# Altium footprint library ICs And Semiconductors SMD.PcbLib: 943 footprints (part 19 of 60)
Each footprint in its own frame and in the unit in brackets; x right, y up, seen from the top. Pads: shape width x height; smd on the part's side, far side on the other; paste and mask are expansions set on the pad; w line width, h text height; cw(c..) or ccw(c..) is an arc to the next point about the centre after c.
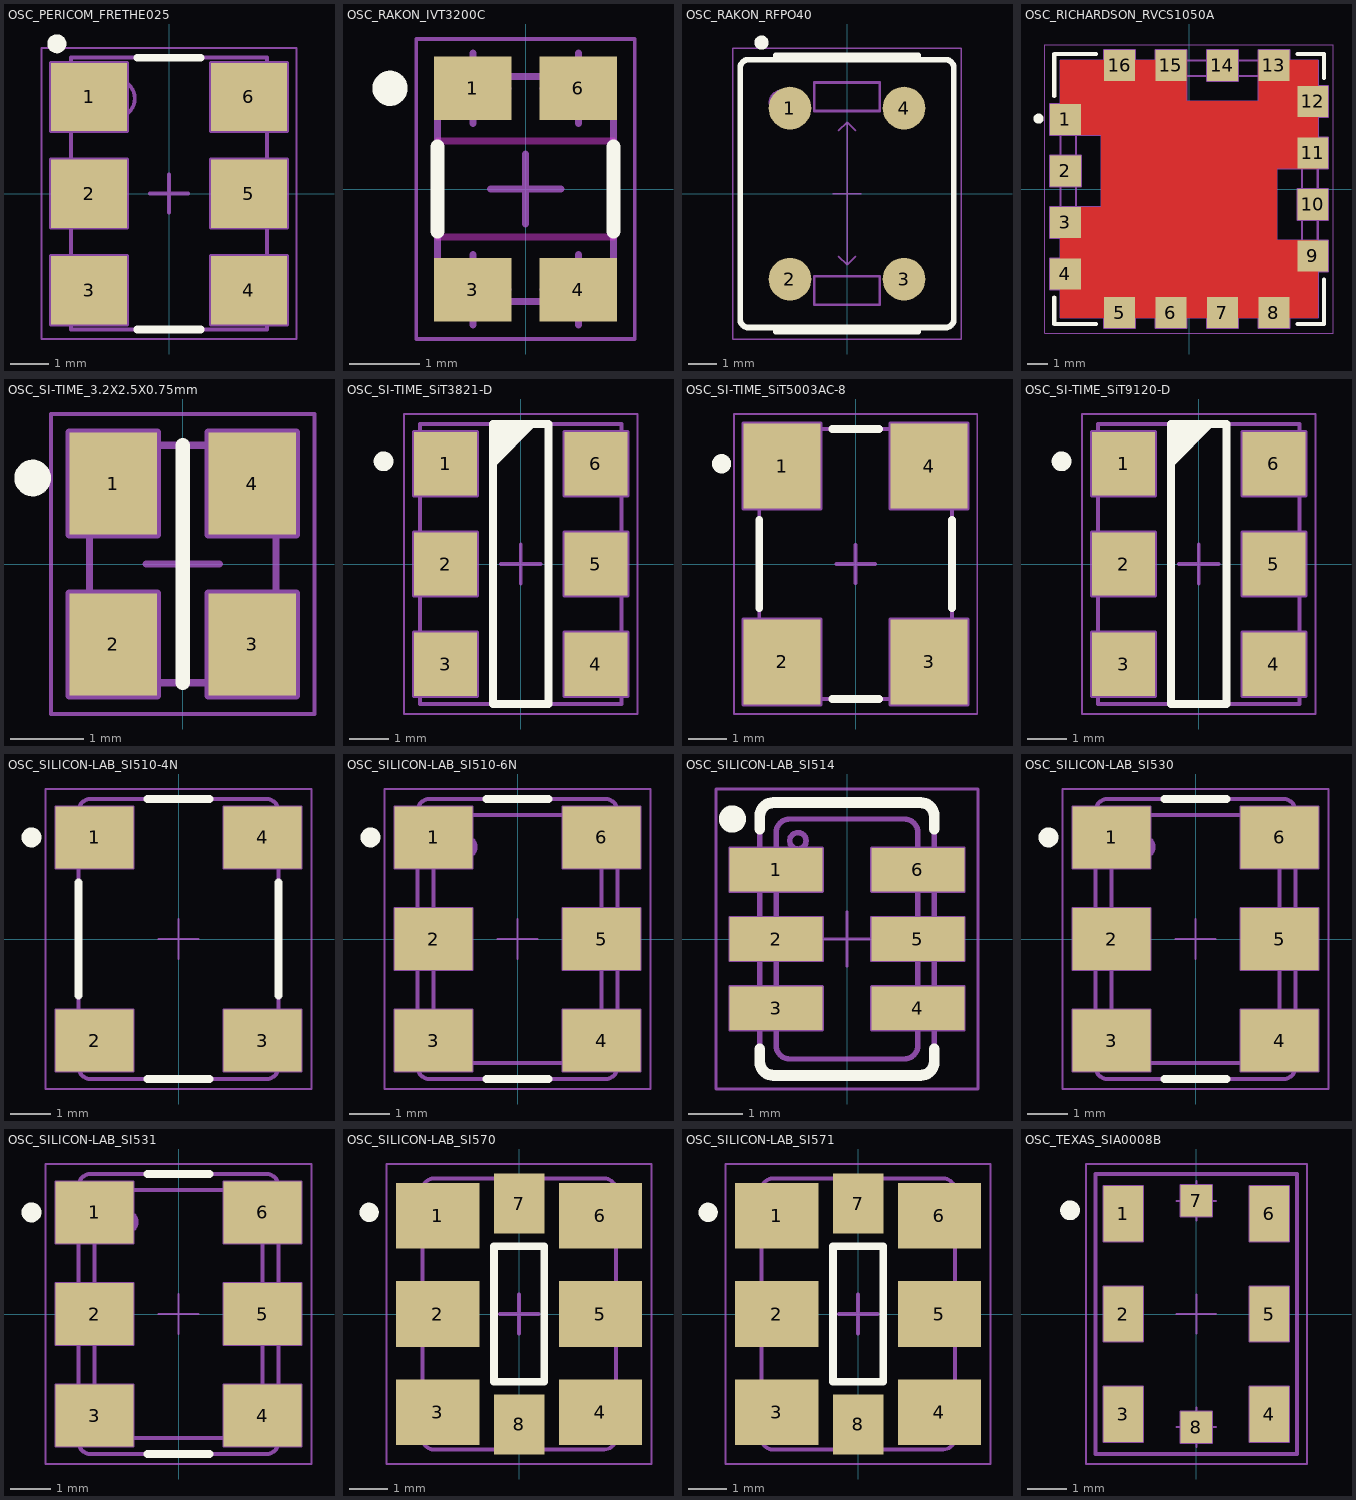
[diagram p18: the footprints below, top view; thin cyan lines are the x and y axes]

## OSC_PERICOM_FRETHE025 [mm] "SMD Oscillator, side convave, 6 pins, 5.00x7.00mm"
height 1.55
pads (6):
  rect 2x1.8 smd: 1(-2.1,2.54) 2(-2.1,0) 3(-2.1,-2.54) 4(2.1,-2.54) 5(2.1,0) 6(2.1,2.54)
Top Overlay:
  circle w0.25: c-2.95,3.94 r0.125
  lines w0.2: -0.832,-3.575 0.832,-3.575 ; -0.832,3.575 0.832,3.575
Mechanical 8:
  lines w0.1: -2.6,-2.54 -2.1,-2.54 ; -2.6,0 -2.1,0 ; -2.6,2.54 -2.1,2.54 ; -2.1,-3.04 -2.1,-2.54 ; -2.1,-2.04 -2.1,-2.54 ; -2.1,-0.5 -2.1,0 ; -2.1,0.5 -2.1,0 ; -2.1,2.04 -2.1,2.54 ; -2.1,3.04 -2.1,2.54 ; -1.6,-2.54 -2.1,-2.54 ; -1.6,0 -2.1,0 ; -1.6,2.54 -2.1,2.54 ; -0.5,0 0,0 ; 0,-0.5 0,0 ; 0,0.5 0,0 ; 0.5,0 0,0 ; 1.6,-2.54 2.1,-2.54 ; 1.6,0 2.1,0 ; 1.6,2.54 2.1,2.54 ; 2.1,-3.04 2.1,-2.54 ; 2.1,-2.04 2.1,-2.54 ; 2.1,-0.5 2.1,0 ; 2.1,0.5 2.1,0 ; 2.1,2.04 2.1,2.54 ; 2.1,3.04 2.1,2.54 ; 2.6,-2.54 2.1,-2.54 ; 2.6,0 2.1,0 ; 2.6,2.54 2.1,2.54 ; -3.1,-3.44 -1.1,-3.44 -1.1,-1.64 -3.1,-1.64 -3.1,-3.44 ; -3.1,-0.9 -1.1,-0.9 -1.1,0.9 -3.1,0.9 -3.1,-0.9 ; -3.1,1.64 -1.1,1.64 -1.1,3.44 -3.1,3.44 -3.1,1.64 ; 1.1,-3.44 3.1,-3.44 3.1,-1.64 1.1,-1.64 1.1,-3.44 ; 1.1,-0.9 3.1,-0.9 3.1,0.9 1.1,0.9 1.1,-0.9 ; 1.1,1.64 3.1,1.64 3.1,3.44 1.1,3.44 1.1,1.64
Mechanical 14:
  circle w0.1: c-1.4,2.5 r0.5
  lines w0.1: -2.575,-3.575 2.575,-3.575 2.575,3.575 -2.575,3.575 -2.575,-3.575
Mechanical 15:
  lines w0.05: -3.35,-3.825 3.35,-3.825 3.35,3.825 -3.35,3.825 -3.35,-3.825
3D body "OSC_PERICOM_FRETHE025.stp": height 1.55, standoff 0, extent -2.575,-3.575 2.575,3.575

## OSC_RAKON_IVT3200C [mm] "Oscillator IVT3200C Serie, Corner Concave; 4 pin, 2.50mm L X 3.2mm W X 1.1mm H"
height 1.1
pads (4):
  rect 1.1x0.9 smd: 1(-0.75,1.43) 3(-0.75,-1.43) 4(0.75,-1.43) 6(0.75,1.43)
Top Layer keep-out:
  lines w0.1: -1.25,-0.68 1.25,-0.68 1.25,0.68 -1.25,0.68 -1.25,-0.68
Top Overlay:
  circle w0.25: c-1.925,1.43 r0.125
  lines w0.2: -1.25,-0.6 -1.25,0.6 ; 1.25,-0.6 1.25,0.6
Mechanical 8:
  lines w0.1: -1.25,-1.43 -0.75,-1.43 ; -1.25,1.43 -0.75,1.43 ; -0.75,-1.93 -0.75,-1.43 ; -0.75,-0.93 -0.75,-1.43 ; -0.75,0.93 -0.75,1.43 ; -0.75,1.93 -0.75,1.43 ; -0.5,0 0,0 ; -0.25,-1.43 -0.75,-1.43 ; -0.25,1.43 -0.75,1.43 ; 0,-0.5 0,0 ; 0,0.5 0,0 ; 0.25,-1.43 0.75,-1.43 ; 0.25,1.43 0.75,1.43 ; 0.5,0 0,0 ; 0.75,-1.93 0.75,-1.43 ; 0.75,-0.93 0.75,-1.43 ; 0.75,0.93 0.75,1.43 ; 0.75,1.93 0.75,1.43 ; 1.25,-1.43 0.75,-1.43 ; 1.25,1.43 0.75,1.43
Mechanical 14:
  lines w0.1: -1.25,-1.5 cw(c-1.25,-1.6) -1.15,-1.6 1.15,-1.6 cw(c1.25,-1.6) 1.25,-1.5 1.25,1.5 cw(c1.25,1.6) 1.15,1.6 -1.15,1.6 cw(c-1.25,1.6) -1.25,1.5 -1.25,-1.5
Mechanical 15:
  lines w0.05: -1.55,-2.13 -1.55,2.13 1.55,2.13 1.55,-2.13 -1.55,-2.13
3D body "OSC_RAKON_IVT3200C.stp": height 1, standoff 0, extent -1.25,-1.6 1.25,1.6

## OSC_RAKON_RFPO40 [mm] "RFPO40 Case, SMD Oscillator, 4 pins, Body 9.7x7.5mm"
height 4.2
pads (4):
  round 1.5 smd: 1(-2,3) 2(-2,-3) 3(2,-3) 4(2,3)
Top Overlay:
  circle w0.25: c-3,5.3 r0.125
  lines w0.2: -2.5,-4.7 -2.5,-4.85 2.5,-4.85 2.5,-4.7 ; -2.5,4.7 -2.5,4.85 2.5,4.85 2.5,4.7 ; -3.75,-4.4 ccw(c-3.45,-4.4) -3.45,-4.7 3.45,-4.7 ccw(c3.45,-4.4) 3.75,-4.4 3.75,4.4 ccw(c3.45,4.4) 3.45,4.7 -3.45,4.7 ccw(c-3.45,4.4) -3.75,4.4 -3.75,-4.4
Mechanical 8:
  lines w0.05: -0.3,-2.2 0,-2.5 ; -0.3,2.2 0,2.5 ; 0.3,-2.2 0,-2.5 ; 0.3,2.2 0,2.5 ; 0,-2.5 0,2.5
  lines w0.1: -2.5,-3 -2,-3 -2,-2.5 ; -2.5,3 -2,3 -2,3.5 ; 1.5,-3 2,-3 2,-2.5 ; 1.5,3 2,3 2,3.5 ; -1.15,-3.9 -1.15,-2.9 1.15,-2.9 1.15,-3.9 -1.15,-3.9 ; -1.15,2.9 -1.15,3.9 1.15,3.9 1.15,2.9 -1.15,2.9
  text "Keepout Area on Top" at -0.5,-2.5 h0.35
Mechanical 14:
  circle w0.1: c-2.3,3.2 r0.4
  lines w0.1: -2.5,-4.7 -2.5,-4.85 2.5,-4.85 2.5,-4.7 ; -2.5,4.7 -2.5,4.85 2.5,4.85 2.5,4.7 ; -3.75,-4.4 ccw(c-3.45,-4.4) -3.45,-4.7 3.45,-4.7 ccw(c3.45,-4.4) 3.75,-4.4 3.75,4.4 ccw(c3.45,4.4) 3.45,4.7 -3.45,4.7 ccw(c-3.45,4.4) -3.75,4.4 -3.75,-4.4
Mechanical 15:
  lines w0.05: -0.5,0 0.5,0 ; 0,-0.5 0,0.5 ; -4,-5.1 -4,5.1 4,5.1 4,-5.1 -4,-5.1
3D body "OSC_RAKON_RFPO40.stp": height 5.95, standoff 0, extent -3.75,-4.85 3.75,4.85

## OSC_RICHARDSON_RVCS1050A [mm] "LCC, 2.54mm Pitch, Square; 16 Pin, 12.7mm L X 12.7mm W X 4.00mm H Body, IPC Medium Density"
height 4
pads (16):
  rect 1.52x1.52 smd: 1(-6.1,3.43) 2(-6.1,0.89) 3(-6.1,-1.65) 4(-6.1,-4.19) 5(-3.43,-6.1) 6(-0.89,-6.1) 7(1.65,-6.1) 8(4.19,-6.1) 9(6.1,-3.3) 10(6.1,-0.76) 11(6.1,1.78) 12(6.1,4.32) 13(4.19,6.1) 14(1.65,6.1) 15(-0.89,6.1) 16(-3.43,6.1)
Top Layer:
  region: -6.35,-0.89 -4.324,-0.89 -4.324,2.67 -6.35,2.67 -6.35,6.35 -0.13,6.35 -0.13,4.324 3.43,4.324 3.43,6.35 6.35,6.35 6.35,1.02 4.324,1.02 4.324,-2.54 6.35,-2.54 6.35,-6.35 -6.35,-6.35
Top Overlay:
  circle w0.25: c-7.425,3.475 r0.125
  lines w0.2: -6.65,-5.35 -6.65,-6.65 -4.59,-6.65 ; -6.65,4.59 -6.65,6.65 -4.59,6.65 ; 5.35,-6.65 6.65,-6.65 6.65,-4.46 ; 5.35,6.65 6.65,6.65 6.65,5.48
Mechanical 8:
  lines w0.1: -6.6,-4.19 -6.1,-4.19 ; -6.6,-1.65 -6.1,-1.65 ; -6.6,0.89 -6.1,0.89 ; -6.6,3.43 -6.1,3.43 ; -6.1,-4.69 -6.1,-4.19 ; -6.1,-3.69 -6.1,-4.19 ; -6.1,-2.15 -6.1,-1.65 ; -6.1,-1.15 -6.1,-1.65 ; -6.1,0.39 -6.1,0.89 ; -6.1,1.39 -6.1,0.89 ; -6.1,2.93 -6.1,3.43 ; -6.1,3.93 -6.1,3.43 ; -5.6,-4.19 -6.1,-4.19 ; -5.6,-1.65 -6.1,-1.65 ; -5.6,0.89 -6.1,0.89 ; -5.6,3.43 -6.1,3.43 ; -3.93,-6.1 -3.43,-6.1 ; -3.93,6.1 -3.43,6.1 ; -3.43,-6.6 -3.43,-6.1 ; -3.43,-5.6 -3.43,-6.1 ; -3.43,5.6 -3.43,6.1 ; -3.43,6.6 -3.43,6.1 ; -2.93,-6.1 -3.43,-6.1 ; -2.93,6.1 -3.43,6.1 ; -1.39,-6.1 -0.89,-6.1 ; -1.39,6.1 -0.89,6.1 ; -0.89,-6.6 -0.89,-6.1 ; -0.89,-5.6 -0.89,-6.1 ; -0.89,5.6 -0.89,6.1 ; -0.89,6.6 -0.89,6.1 ; -0.5,0 0,0 ; -0.39,-6.1 -0.89,-6.1 ; -0.39,6.1 -0.89,6.1 ; 0,-0.5 0,0 ; 0,0.5 0,0 ; 0.5,0 0,0 ; 1.15,-6.1 1.65,-6.1 ; 1.15,6.1 1.65,6.1 ; 1.65,-6.6 1.65,-6.1 ; 1.65,-5.6 1.65,-6.1 ; 1.65,5.6 1.65,6.1 ; 1.65,6.6 1.65,6.1 ; 2.15,-6.1 1.65,-6.1 ; 2.15,6.1 1.65,6.1 ; 3.69,-6.1 4.19,-6.1 ; 3.69,6.1 4.19,6.1 ; 4.19,-6.6 4.19,-6.1 ; 4.19,-5.6 4.19,-6.1 ; 4.19,5.6 4.19,6.1 ; 4.19,6.6 4.19,6.1 ; 4.69,-6.1 4.19,-6.1 ; 4.69,6.1 4.19,6.1 ; 5.6,-3.3 6.1,-3.3 ; 5.6,-0.76 6.1,-0.76 ; 5.6,1.78 6.1,1.78 ; 5.6,4.32 6.1,4.32 ; 6.1,-3.8 6.1,-3.3 ; 6.1,-2.8 6.1,-3.3 ; 6.1,-1.26 6.1,-0.76 ; 6.1,-0.26 6.1,-0.76 ; 6.1,1.28 6.1,1.78 ; 6.1,2.28 6.1,1.78 ; 6.1,3.82 6.1,4.32 ; 6.1,4.82 6.1,4.32 ; 6.6,-3.3 6.1,-3.3 ; 6.6,-0.76 6.1,-0.76 ; 6.6,1.78 6.1,1.78 ; 6.6,4.32 6.1,4.32 ; -6.86,-4.95 -6.86,-3.43 -5.34,-3.43 -5.34,-4.95 -6.86,-4.95 ; -6.86,-2.41 -6.86,-0.89 -5.34,-0.89 -5.34,-2.41 -6.86,-2.41 ; -6.86,0.13 -6.86,1.65 -5.34,1.65 -5.34,0.13 -6.86,0.13 ; -6.86,2.67 -6.86,4.19 -5.34,4.19 -5.34,2.67 -6.86,2.67 ; -6.35,-6.35 6.35,-6.35 6.35,-2.54 4.324,-2.54 4.324,1.02 6.35,1.02 6.35,6.35 3.43,6.35 3.43,4.324 -0.13,4.324 -0.13,6.35 -6.35,6.35 -6.35,2.67 -4.324,2.67 -4.324,-0.89 -6.35,-0.89 -6.35,-6.35 ; -4.19,-6.86 -4.19,-5.34 -2.67,-5.34 -2.67,-6.86 -4.19,-6.86 ; -4.19,5.34 -4.19,6.86 -2.67,6.86 -2.67,5.34 -4.19,5.34 ; -1.65,-6.86 -1.65,-5.34 -0.13,-5.34 -0.13,-6.86 -1.65,-6.86 ; -1.65,5.34 -1.65,6.86 -0.13,6.86 -0.13,5.34 -1.65,5.34 ; 0.89,-6.86 0.89,-5.34 2.41,-5.34 2.41,-6.86 0.89,-6.86 ; 0.89,5.34 0.89,6.86 2.41,6.86 2.41,5.34 0.89,5.34 ; 3.43,-6.86 3.43,-5.34 4.95,-5.34 4.95,-6.86 3.43,-6.86 ; 3.43,5.34 3.43,6.86 4.95,6.86 4.95,5.34 3.43,5.34 ; 5.34,-4.06 5.34,-2.54 6.86,-2.54 6.86,-4.06 5.34,-4.06 ; 5.34,-1.52 5.34,0 6.86,0 6.86,-1.52 5.34,-1.52 ; 5.34,1.02 5.34,2.54 6.86,2.54 6.86,1.02 5.34,1.02 ; 5.34,3.56 5.34,5.08 6.86,5.08 6.86,3.56 5.34,3.56
Mechanical 14:
  circle w0.1: c-4.28,4.28 r0.5
  lines w0.1: -6.35,-6.35 -3.95,-6.35 cw(c-3.43,-6.65) -2.91,-6.35 -1.41,-6.35 cw(c-0.89,-6.65) -0.37,-6.35 1.13,-6.35 cw(c1.65,-6.65) 2.17,-6.35 3.67,-6.35 cw(c4.19,-6.65) 4.71,-6.35 6.35,-6.35 6.35,-3.82 cw(c6.65,-3.3) 6.35,-2.78 6.35,-1.28 cw(c6.65,-0.76) 6.35,-0.24 6.35,1.26 cw(c6.65,1.78) 6.35,2.3 6.35,3.8 cw(c6.65,4.32) 6.35,4.84 6.35,6.35 4.71,6.35 cw(c4.19,6.65) 3.67,6.35 2.17,6.35 cw(c1.65,6.65) 1.13,6.35 -0.37,6.35 cw(c-0.89,6.65) -1.41,6.35 -2.91,6.35 cw(c-3.43,6.65) -3.95,6.35 -6.35,6.35 -6.35,3.95 cw(c-6.65,3.43) -6.35,2.91 -6.35,1.41 cw(c-6.65,0.89) -6.35,0.37 -6.35,-1.13 cw(c-6.65,-1.65) -6.35,-2.17 -6.35,-3.67 cw(c-6.65,-4.19) -6.35,-4.71 -6.35,-6.35 ; -5.58,-5.28 ccw(c-5.28,-5.28) -5.28,-5.58 5.28,-5.58 ccw(c5.28,-5.28) 5.58,-5.28 5.58,5.28 ccw(c5.28,5.28) 5.28,5.58 -5.28,5.58 ccw(c-5.28,5.28) -5.58,5.28 -5.58,-5.28
Mechanical 15:
  lines w0.05: -7.11,-7.11 -7.11,7.11 7.11,7.11 7.11,-7.11 -7.11,-7.11
3D body "OSC_RICHARDSON_RVCS1050A.stp": height 4, standoff 0, extent -6.35,-6.35 6.35,6.35

## OSC_SI-TIME_3.2X2.5X0.75mm [mm] "Si Time Oscillators, 4 Pin, Pitch 2.1mm, 3.2mm x 2.5mm x0.75mm"
height 0.8
pads (4):
  rect 1.2x1.4 smd: 1(-0.95,1.1) 2(-0.95,-1.1) 3(0.95,-1.1) 4(0.95,1.1)
Top Overlay:
  circle w0.25: c-2.05,1.175 r0.125
  lines w0.2: 0,-1.625 0,1.625
Mechanical 8:
  lines w0.1: -1.45,-1.1 -0.95,-1.1 ; -1.45,1.1 -0.95,1.1 ; -0.95,-1.6 -0.95,-1.1 ; -0.95,-0.6 -0.95,-1.1 ; -0.95,0.6 -0.95,1.1 ; -0.95,1.6 -0.95,1.1 ; -0.5,0 0,0 ; -0.45,-1.1 -0.95,-1.1 ; -0.45,1.1 -0.95,1.1 ; 0,-0.5 0,0 ; 0,0.5 0,0 ; 0.45,-1.1 0.95,-1.1 ; 0.45,1.1 0.95,1.1 ; 0.5,0 0,0 ; 0.95,-1.6 0.95,-1.1 ; 0.95,-0.6 0.95,-1.1 ; 0.95,0.6 0.95,1.1 ; 0.95,1.6 0.95,1.1 ; 1.45,-1.1 0.95,-1.1 ; 1.45,1.1 0.95,1.1 ; -1.55,-1.8 -1.55,-0.4 -0.35,-0.4 -0.35,-1.8 -1.55,-1.8 ; -1.55,0.4 -1.55,1.8 -0.35,1.8 -0.35,0.4 -1.55,0.4 ; 0.35,-1.8 0.35,-0.4 1.55,-0.4 1.55,-1.8 0.35,-1.8 ; 0.35,0.4 0.35,1.8 1.55,1.8 1.55,0.4 0.35,0.4
Mechanical 14:
  circle w0.1: c-0.775,1.125 r0.25
  lines w0.1: -1.275,-1.625 1.275,-1.625 1.275,1.625 -1.275,1.625 -1.275,-1.625
Mechanical 15:
  lines w0.05: -1.8,-2.05 -1.8,2.05 1.8,2.05 1.8,-2.05 -1.8,-2.05
3D body "OSC_SI-TIME_3.2X2.5X0.75.stp": height 0.8, standoff 0, extent -1.275,-1.625 1.275,1.625

## OSC_SI-TIME_SiT3821-D [mm] "SiT3821 Oscillators Series, Version 7mmx5mm, Pitch 2.54mm; 6 Pin"
height 1
pads (6):
  rect 1.6x1.6 smd: 1(-1.905,2.54) 2(-1.905,0) 3(-1.905,-2.54) 4(1.905,-2.54) 5(1.905,0) 6(1.905,2.54)
Top Overlay:
  circle w0.25: c-3.475,2.6 r0.125
  lines w0.2: -0.705,2.55 0.295,3.55 ; -0.705,2.75 0.095,3.55 ; -0.705,2.95 -0.105,3.55 ; -0.705,3.15 -0.305,3.55 ; -0.705,3.35 -0.505,3.55 ; -0.705,-3.55 0.705,-3.55 0.705,3.55 -0.705,3.55 -0.705,-3.55
Mechanical 8:
  lines w0.1: -2.405,-2.54 -1.905,-2.54 ; -2.405,0 -1.905,0 ; -2.405,2.54 -1.905,2.54 ; -1.905,-3.04 -1.905,-2.54 ; -1.905,-2.04 -1.905,-2.54 ; -1.905,-0.5 -1.905,0 ; -1.905,0.5 -1.905,0 ; -1.905,2.04 -1.905,2.54 ; -1.905,3.04 -1.905,2.54 ; -1.405,-2.54 -1.905,-2.54 ; -1.405,0 -1.905,0 ; -1.405,2.54 -1.905,2.54 ; -0.5,0 0,0 ; 0,-0.5 0,0 ; 0,0.5 0,0 ; 0.5,0 0,0 ; 1.405,-2.54 1.905,-2.54 ; 1.405,0 1.905,0 ; 1.405,2.54 1.905,2.54 ; 1.905,-3.04 1.905,-2.54 ; 1.905,-2.04 1.905,-2.54 ; 1.905,-0.5 1.905,0 ; 1.905,0.5 1.905,0 ; 1.905,2.04 1.905,2.54 ; 1.905,3.04 1.905,2.54 ; 2.405,-2.54 1.905,-2.54 ; 2.405,0 1.905,0 ; 2.405,2.54 1.905,2.54 ; -2.705,-3.34 -2.705,-1.74 -1.105,-1.74 -1.105,-3.34 -2.705,-3.34 ; -2.705,-0.8 -2.705,0.8 -1.105,0.8 -1.105,-0.8 -2.705,-0.8 ; -2.705,1.74 -2.705,3.34 -1.105,3.34 -1.105,1.74 -2.705,1.74 ; 1.105,-3.34 1.105,-1.74 2.705,-1.74 2.705,-3.34 1.105,-3.34 ; 1.105,-0.8 1.105,0.8 2.705,0.8 2.705,-0.8 1.105,-0.8 ; 1.105,1.74 1.105,3.34 2.705,3.34 2.705,1.74 1.105,1.74
Mechanical 14:
  circle w0.1: c-1.505,2.55 r0.4
  lines w0.1: -2.55,-3.55 2.55,-3.55 2.55,3.55 -2.55,3.55 -2.55,-3.55
Mechanical 15:
  lines w0.05: -2.955,-3.8 -2.955,3.8 2.955,3.8 2.955,-3.8 -2.955,-3.8
3D body "OSC_SI TIME_SiT3821-D.stp": height 1, standoff 0, extent -2.55,-3.55 2.55,3.55

## OSC_SI-TIME_SiT5003AC-8 [mm] "SiT5003AC Oscillator, Version 5.08mm Pitch; 4 Pin, 5.00mm L X 7.00mm W X 1mm H"
height 1
pads (4):
  rect 2x2.2 smd: 1(-1.905,2.54) 2(-1.905,-2.54) 3(1.905,-2.54) 4(1.905,2.54)
Top Overlay:
  circle w0.25: c-3.475,2.6 r0.125
  lines w0.2: -2.5,-1.14 -2.5,1.14 ; -0.605,-3.5 0.605,-3.5 ; -0.605,3.5 0.605,3.5 ; 2.5,-1.14 2.5,1.14
Mechanical 8:
  lines w0.1: -2.405,-2.54 -1.905,-2.54 ; -2.405,2.54 -1.905,2.54 ; -1.905,-3.04 -1.905,-2.54 ; -1.905,-2.04 -1.905,-2.54 ; -1.905,2.04 -1.905,2.54 ; -1.905,3.04 -1.905,2.54 ; -1.405,-2.54 -1.905,-2.54 ; -1.405,2.54 -1.905,2.54 ; -0.5,0 0,0 ; 0,-0.5 0,0 ; 0,0.5 0,0 ; 0.5,0 0,0 ; 1.405,-2.54 1.905,-2.54 ; 1.405,2.54 1.905,2.54 ; 1.905,-3.04 1.905,-2.54 ; 1.905,-2.04 1.905,-2.54 ; 1.905,2.04 1.905,2.54 ; 1.905,3.04 1.905,2.54 ; 2.405,-2.54 1.905,-2.54 ; 2.405,2.54 1.905,2.54 ; -2.905,-3.64 -0.905,-3.64 -0.905,-1.44 -2.905,-1.44 -2.905,-3.64 ; -2.905,1.44 -0.905,1.44 -0.905,3.64 -2.905,3.64 -2.905,1.44 ; 0.905,-3.64 2.905,-3.64 2.905,-1.44 0.905,-1.44 0.905,-3.64 ; 0.905,1.44 2.905,1.44 2.905,3.64 0.905,3.64 0.905,1.44
Mechanical 14:
  circle w0.1: c-1.505,2.55 r0.4
  lines w0.1: -2.5,-3.5 -2.5,3.5 2.5,3.5 2.5,-3.5 -2.5,-3.5
Mechanical 15:
  lines w0.05: -3.155,-3.89 -3.155,3.89 3.155,3.89 3.155,-3.89 -3.155,-3.89
3D body "OSC_SI-TIME_SiT5003AC-8.stp": height 1, standoff 0, extent -2.5,-3.5 2.5,3.5

## OSC_SI-TIME_SiT9120-D [mm] "SiT9120 Oscillators Series, Version 7mmx5mm, Pitch 2.54mm; 6 Pin"
height 1
pads (6):
  rect 1.6x1.6 smd: 1(-1.905,2.54) 2(-1.905,0) 3(-1.905,-2.54) 4(1.905,-2.54) 5(1.905,0) 6(1.905,2.54)
Top Overlay:
  circle w0.25: c-3.475,2.6 r0.125
  lines w0.2: -0.705,2.55 0.295,3.55 ; -0.705,2.75 0.095,3.55 ; -0.705,2.95 -0.105,3.55 ; -0.705,3.15 -0.305,3.55 ; -0.705,3.35 -0.505,3.55 ; -0.705,-3.55 0.705,-3.55 0.705,3.55 -0.705,3.55 -0.705,-3.55
Mechanical 8:
  lines w0.1: -2.405,-2.54 -1.905,-2.54 ; -2.405,0 -1.905,0 ; -2.405,2.54 -1.905,2.54 ; -1.905,-3.04 -1.905,-2.54 ; -1.905,-2.04 -1.905,-2.54 ; -1.905,-0.5 -1.905,0 ; -1.905,0.5 -1.905,0 ; -1.905,2.04 -1.905,2.54 ; -1.905,3.04 -1.905,2.54 ; -1.405,-2.54 -1.905,-2.54 ; -1.405,0 -1.905,0 ; -1.405,2.54 -1.905,2.54 ; -0.5,0 0,0 ; 0,-0.5 0,0 ; 0,0.5 0,0 ; 0.5,0 0,0 ; 1.405,-2.54 1.905,-2.54 ; 1.405,0 1.905,0 ; 1.405,2.54 1.905,2.54 ; 1.905,-3.04 1.905,-2.54 ; 1.905,-2.04 1.905,-2.54 ; 1.905,-0.5 1.905,0 ; 1.905,0.5 1.905,0 ; 1.905,2.04 1.905,2.54 ; 1.905,3.04 1.905,2.54 ; 2.405,-2.54 1.905,-2.54 ; 2.405,0 1.905,0 ; 2.405,2.54 1.905,2.54 ; -2.705,-3.34 -2.705,-1.74 -1.105,-1.74 -1.105,-3.34 -2.705,-3.34 ; -2.705,-0.8 -2.705,0.8 -1.105,0.8 -1.105,-0.8 -2.705,-0.8 ; -2.705,1.74 -2.705,3.34 -1.105,3.34 -1.105,1.74 -2.705,1.74 ; 1.105,-3.34 1.105,-1.74 2.705,-1.74 2.705,-3.34 1.105,-3.34 ; 1.105,-0.8 1.105,0.8 2.705,0.8 2.705,-0.8 1.105,-0.8 ; 1.105,1.74 1.105,3.34 2.705,3.34 2.705,1.74 1.105,1.74
Mechanical 14:
  circle w0.1: c-1.505,2.55 r0.4
  lines w0.1: -2.55,-3.55 2.55,-3.55 2.55,3.55 -2.55,3.55 -2.55,-3.55
Mechanical 15:
  lines w0.05: -2.955,-3.8 -2.955,3.8 2.955,3.8 2.955,-3.8 -2.955,-3.8
3D body "OSC_SI-TIME_SiT9120-D.stp": height 1, standoff 0, extent -2.55,-3.55 2.55,3.55

## OSC_SILICON-LAB_SI510-4N [mm] "Oscillator Si510 Series, 4 pins, 5x7mm"
height 1.8
pads (4):
  rect 1.95x1.55 smd: 1(-2.1,2.54) 2(-2.1,-2.54) 3(2.1,-2.54) 4(2.1,2.54)
Top Overlay:
  circle w0.25: c-3.675,2.54 r0.125
  lines w0.2: -2.5,-1.415 -2.5,1.415 ; -0.775,-3.5 0.775,-3.5 ; -0.775,3.5 0.775,3.5 ; 2.5,-1.415 2.5,1.415
Mechanical 8:
  lines w0.05: -2.6,-2.54 -2.1,-2.54 ; -2.6,2.54 -2.1,2.54 ; -2.1,-3.04 -2.1,-2.54 ; -2.1,-2.04 -2.1,-2.54 ; -2.1,2.04 -2.1,2.54 ; -2.1,3.04 -2.1,2.54 ; -1.6,-2.54 -2.1,-2.54 ; -1.6,2.54 -2.1,2.54 ; -0.5,0 0,0 ; 0,-0.5 0,0 ; 0,0.5 0,0 ; 0.5,0 0,0 ; 1.6,-2.54 2.1,-2.54 ; 1.6,2.54 2.1,2.54 ; 2.1,-3.04 2.1,-2.54 ; 2.1,-2.04 2.1,-2.54 ; 2.1,2.04 2.1,2.54 ; 2.1,3.04 2.1,2.54 ; 2.6,-2.54 2.1,-2.54 ; 2.6,2.54 2.1,2.54 ; -3.075,-3.315 -3.075,-1.765 -1.125,-1.765 -1.125,-3.315 -3.075,-3.315 ; -3.075,1.765 -3.075,3.315 -1.125,3.315 -1.125,1.765 -3.075,1.765 ; 1.125,-3.315 1.125,-1.765 3.075,-1.765 3.075,-3.315 1.125,-3.315 ; 1.125,1.765 1.125,3.315 3.075,3.315 3.075,1.765 1.125,1.765
Mechanical 14:
  circle w0.1: c-1.7,2.55 r0.4
  lines w0.1: -2.5,-3.2 ccw(c-2.2,-3.2) -2.2,-3.5 2.2,-3.5 ccw(c2.2,-3.2) 2.5,-3.2 2.5,3.2 ccw(c2.2,3.2) 2.2,3.5 -2.2,3.5 ccw(c-2.2,3.2) -2.5,3.2 -2.5,-3.2
Mechanical 15:
  lines w0.05: -3.325,-3.75 3.325,-3.75 3.325,3.75 -3.325,3.75 -3.325,-3.75
3D body "OSC_SILICON-LAB_SI510-4N.stp": height 1.8, standoff 0, extent -2.5,-3.5 2.5,3.5

## OSC_SILICON-LAB_SI510-6N [mm] "Oscillator Si510 Series, 6 pins, 5x7mm"
height 1.8
pads (6):
  rect 1.95x1.55 smd: 1(-2.1,2.54) 2(-2.1,0) 3(-2.1,-2.54) 4(2.1,-2.54) 5(2.1,0) 6(2.1,2.54)
Top Overlay:
  circle w0.25: c-3.675,2.54 r0.125
  lines w0.2: -0.775,-3.5 0.775,-3.5 ; -0.775,3.5 0.775,3.5
Mechanical 8:
  lines w0.05: -2.6,-2.54 -2.1,-2.54 ; -2.6,0 -2.1,0 ; -2.6,2.54 -2.1,2.54 ; -2.1,-3.04 -2.1,-2.54 ; -2.1,-2.04 -2.1,-2.54 ; -2.1,-0.5 -2.1,0 ; -2.1,0.5 -2.1,0 ; -2.1,2.04 -2.1,2.54 ; -2.1,3.04 -2.1,2.54 ; -1.6,-2.54 -2.1,-2.54 ; -1.6,0 -2.1,0 ; -1.6,2.54 -2.1,2.54 ; -0.5,0 0,0 ; 0,-0.5 0,0 ; 0,0.5 0,0 ; 0.5,0 0,0 ; 1.6,-2.54 2.1,-2.54 ; 1.6,0 2.1,0 ; 1.6,2.54 2.1,2.54 ; 2.1,-3.04 2.1,-2.54 ; 2.1,-2.04 2.1,-2.54 ; 2.1,-0.5 2.1,0 ; 2.1,0.5 2.1,0 ; 2.1,2.04 2.1,2.54 ; 2.1,3.04 2.1,2.54 ; 2.6,-2.54 2.1,-2.54 ; 2.6,0 2.1,0 ; 2.6,2.54 2.1,2.54 ; -3.075,-3.315 -3.075,-1.765 -1.125,-1.765 -1.125,-3.315 -3.075,-3.315 ; -3.075,-0.775 -3.075,0.775 -1.125,0.775 -1.125,-0.775 -3.075,-0.775 ; -3.075,1.765 -3.075,3.315 -1.125,3.315 -1.125,1.765 -3.075,1.765 ; 1.125,-3.315 1.125,-1.765 3.075,-1.765 3.075,-3.315 1.125,-3.315 ; 1.125,-0.775 1.125,0.775 3.075,0.775 3.075,-0.775 1.125,-0.775 ; 1.125,1.765 1.125,3.315 3.075,3.315 3.075,1.765 1.125,1.765
Mechanical 14:
  circle w0.1: c-1.3,2.3 r0.25
  lines w0.1: -2.5,-3.2 ccw(c-2.2,-3.2) -2.2,-3.5 2.2,-3.5 ccw(c2.2,-3.2) 2.5,-3.2 2.5,3.2 ccw(c2.2,3.2) 2.2,3.5 -2.2,3.5 ccw(c-2.2,3.2) -2.5,3.2 -2.5,-3.2 ; -2.1,-2.8 ccw(c-1.8,-2.8) -1.8,-3.1 1.8,-3.1 ccw(c1.8,-2.8) 2.1,-2.8 2.1,2.8 ccw(c1.8,2.8) 1.8,3.1 -1.8,3.1 ccw(c-1.8,2.8) -2.1,2.8 -2.1,-2.8
Mechanical 15:
  lines w0.05: -3.325,-3.75 3.325,-3.75 3.325,3.75 -3.325,3.75 -3.325,-3.75
3D body "OSC_SILICON-LAB_SI510-6N.stp": height 1.8, standoff 0, extent -2.5,-3.5 2.5,3.5

## OSC_SILICON-LAB_SI514 [mm] "Oscillator Si514 Series, 6 pins, 3.2x5mm"
height 1.28
pads (6):
  rect 1.7x0.8 smd: 1(-1.3,1.27) 2(-1.3,0) 3(-1.3,-1.27) 4(1.3,-1.27) 5(1.3,0) 6(1.3,1.27)
Top Overlay:
  circle w0.25: c-2.1,2.2 r0.125
  lines w0.2: -1.6,-2.02 -1.6,-2.25 ccw(c-1.35,-2.25) -1.35,-2.5 1.35,-2.5 ccw(c1.35,-2.25) 1.6,-2.25 1.6,-2.02 ; -1.6,2.02 -1.6,2.25 cw(c-1.35,2.25) -1.35,2.5 1.35,2.5 cw(c1.35,2.25) 1.6,2.25 1.6,2.02
Mechanical 8:
  lines w0.05: -1.8,-1.27 -1.3,-1.27 ; -1.8,0 -1.3,0 ; -1.8,1.27 -1.3,1.27 ; -1.3,-1.77 -1.3,-1.27 ; -1.3,-0.77 -1.3,-1.27 ; -1.3,-0.5 -1.3,0 ; -1.3,0.5 -1.3,0 ; -1.3,0.77 -1.3,1.27 ; -1.3,1.77 -1.3,1.27 ; -0.8,-1.27 -1.3,-1.27 ; -0.8,0 -1.3,0 ; -0.8,1.27 -1.3,1.27 ; -0.5,0 0,0 ; 0,-0.5 0,0 ; 0,0.5 0,0 ; 0.5,0 0,0 ; 0.8,-1.27 1.3,-1.27 ; 0.8,0 1.3,0 ; 0.8,1.27 1.3,1.27 ; 1.3,-1.77 1.3,-1.27 ; 1.3,-0.77 1.3,-1.27 ; 1.3,-0.5 1.3,0 ; 1.3,0.5 1.3,0 ; 1.3,0.77 1.3,1.27 ; 1.3,1.77 1.3,1.27 ; 1.8,-1.27 1.3,-1.27 ; 1.8,0 1.3,0 ; 1.8,1.27 1.3,1.27 ; -2.15,-1.67 -2.15,-0.87 -0.45,-0.87 -0.45,-1.67 -2.15,-1.67 ; -2.15,-0.4 -2.15,0.4 -0.45,0.4 -0.45,-0.4 -2.15,-0.4 ; -2.15,0.87 -2.15,1.67 -0.45,1.67 -0.45,0.87 -2.15,0.87 ; 0.45,-1.67 0.45,-0.87 2.15,-0.87 2.15,-1.67 0.45,-1.67 ; 0.45,-0.4 0.45,0.4 2.15,0.4 2.15,-0.4 0.45,-0.4 ; 0.45,0.87 0.45,1.67 2.15,1.67 2.15,0.87 0.45,0.87
Mechanical 14:
  circle w0.1: c-0.9,1.8 r0.15
  lines w0.1: -1.6,-2.25 ccw(c-1.35,-2.25) -1.35,-2.5 1.35,-2.5 ccw(c1.35,-2.25) 1.6,-2.25 1.6,2.25 ccw(c1.35,2.25) 1.35,2.5 -1.35,2.5 ccw(c-1.35,2.25) -1.6,2.25 -1.6,-2.25 ; -1.3,-1.95 ccw(c-1.05,-1.95) -1.05,-2.2 1.05,-2.2 ccw(c1.05,-1.95) 1.3,-1.95 1.3,1.95 ccw(c1.05,1.95) 1.05,2.2 -1.05,2.2 ccw(c-1.05,1.95) -1.3,1.95 -1.3,-1.95
Mechanical 15:
  lines w0.05: -2.4,-2.75 2.4,-2.75 2.4,2.75 -2.4,2.75 -2.4,-2.75
3D body "OSC_SILICON-LAB_SI514.stp": height 1.28, standoff 0, extent -1.6,-2.5 1.6,2.5

## OSC_SILICON-LAB_SI530 [mm] "Oscillator Si530 Series, 6 pins, 5x7mm"
height 1.8
pads (6):
  rect 1.95x1.55 smd: 1(-2.1,2.54) 2(-2.1,0) 3(-2.1,-2.54) 4(2.1,-2.54) 5(2.1,0) 6(2.1,2.54)
Top Overlay:
  circle w0.25: c-3.675,2.54 r0.125
  lines w0.2: -0.775,-3.5 0.775,-3.5 ; -0.775,3.5 0.775,3.5
Mechanical 8:
  lines w0.05: -2.6,-2.54 -2.1,-2.54 ; -2.6,0 -2.1,0 ; -2.6,2.54 -2.1,2.54 ; -2.1,-3.04 -2.1,-2.54 ; -2.1,-2.04 -2.1,-2.54 ; -2.1,-0.5 -2.1,0 ; -2.1,0.5 -2.1,0 ; -2.1,2.04 -2.1,2.54 ; -2.1,3.04 -2.1,2.54 ; -1.6,-2.54 -2.1,-2.54 ; -1.6,0 -2.1,0 ; -1.6,2.54 -2.1,2.54 ; -0.5,0 0,0 ; 0,-0.5 0,0 ; 0,0.5 0,0 ; 0.5,0 0,0 ; 1.6,-2.54 2.1,-2.54 ; 1.6,0 2.1,0 ; 1.6,2.54 2.1,2.54 ; 2.1,-3.04 2.1,-2.54 ; 2.1,-2.04 2.1,-2.54 ; 2.1,-0.5 2.1,0 ; 2.1,0.5 2.1,0 ; 2.1,2.04 2.1,2.54 ; 2.1,3.04 2.1,2.54 ; 2.6,-2.54 2.1,-2.54 ; 2.6,0 2.1,0 ; 2.6,2.54 2.1,2.54 ; -3.075,-3.315 -3.075,-1.765 -1.125,-1.765 -1.125,-3.315 -3.075,-3.315 ; -3.075,-0.775 -3.075,0.775 -1.125,0.775 -1.125,-0.775 -3.075,-0.775 ; -3.075,1.765 -3.075,3.315 -1.125,3.315 -1.125,1.765 -3.075,1.765 ; 1.125,-3.315 1.125,-1.765 3.075,-1.765 3.075,-3.315 1.125,-3.315 ; 1.125,-0.775 1.125,0.775 3.075,0.775 3.075,-0.775 1.125,-0.775 ; 1.125,1.765 1.125,3.315 3.075,3.315 3.075,1.765 1.125,1.765
Mechanical 14:
  circle w0.1: c-1.3,2.3 r0.25
  lines w0.1: -2.5,-3.2 ccw(c-2.2,-3.2) -2.2,-3.5 2.2,-3.5 ccw(c2.2,-3.2) 2.5,-3.2 2.5,3.2 ccw(c2.2,3.2) 2.2,3.5 -2.2,3.5 ccw(c-2.2,3.2) -2.5,3.2 -2.5,-3.2 ; -2.1,-2.8 ccw(c-1.8,-2.8) -1.8,-3.1 1.8,-3.1 ccw(c1.8,-2.8) 2.1,-2.8 2.1,2.8 ccw(c1.8,2.8) 1.8,3.1 -1.8,3.1 ccw(c-1.8,2.8) -2.1,2.8 -2.1,-2.8
Mechanical 15:
  lines w0.05: -3.325,-3.75 3.325,-3.75 3.325,3.75 -3.325,3.75 -3.325,-3.75
3D body "OSC_SILICON-LAB_SI510-6N.stp": height 1.8, standoff 0, extent -2.5,-3.5 2.5,3.5

## OSC_SILICON-LAB_SI531 [mm] "Oscillator Si531 Series, 6 pins, 5x7mm"
height 1.8
pads (6):
  rect 1.95x1.55 smd: 1(-2.1,2.54) 2(-2.1,0) 3(-2.1,-2.54) 4(2.1,-2.54) 5(2.1,0) 6(2.1,2.54)
Top Overlay:
  circle w0.25: c-3.675,2.54 r0.125
  lines w0.2: -0.775,-3.5 0.775,-3.5 ; -0.775,3.5 0.775,3.5
Mechanical 8:
  lines w0.05: -2.6,-2.54 -2.1,-2.54 ; -2.6,0 -2.1,0 ; -2.6,2.54 -2.1,2.54 ; -2.1,-3.04 -2.1,-2.54 ; -2.1,-2.04 -2.1,-2.54 ; -2.1,-0.5 -2.1,0 ; -2.1,0.5 -2.1,0 ; -2.1,2.04 -2.1,2.54 ; -2.1,3.04 -2.1,2.54 ; -1.6,-2.54 -2.1,-2.54 ; -1.6,0 -2.1,0 ; -1.6,2.54 -2.1,2.54 ; -0.5,0 0,0 ; 0,-0.5 0,0 ; 0,0.5 0,0 ; 0.5,0 0,0 ; 1.6,-2.54 2.1,-2.54 ; 1.6,0 2.1,0 ; 1.6,2.54 2.1,2.54 ; 2.1,-3.04 2.1,-2.54 ; 2.1,-2.04 2.1,-2.54 ; 2.1,-0.5 2.1,0 ; 2.1,0.5 2.1,0 ; 2.1,2.04 2.1,2.54 ; 2.1,3.04 2.1,2.54 ; 2.6,-2.54 2.1,-2.54 ; 2.6,0 2.1,0 ; 2.6,2.54 2.1,2.54 ; -3.075,-3.315 -3.075,-1.765 -1.125,-1.765 -1.125,-3.315 -3.075,-3.315 ; -3.075,-0.775 -3.075,0.775 -1.125,0.775 -1.125,-0.775 -3.075,-0.775 ; -3.075,1.765 -3.075,3.315 -1.125,3.315 -1.125,1.765 -3.075,1.765 ; 1.125,-3.315 1.125,-1.765 3.075,-1.765 3.075,-3.315 1.125,-3.315 ; 1.125,-0.775 1.125,0.775 3.075,0.775 3.075,-0.775 1.125,-0.775 ; 1.125,1.765 1.125,3.315 3.075,3.315 3.075,1.765 1.125,1.765
Mechanical 14:
  circle w0.1: c-1.3,2.3 r0.25
  lines w0.1: -2.5,-3.2 ccw(c-2.2,-3.2) -2.2,-3.5 2.2,-3.5 ccw(c2.2,-3.2) 2.5,-3.2 2.5,3.2 ccw(c2.2,3.2) 2.2,3.5 -2.2,3.5 ccw(c-2.2,3.2) -2.5,3.2 -2.5,-3.2 ; -2.1,-2.8 ccw(c-1.8,-2.8) -1.8,-3.1 1.8,-3.1 ccw(c1.8,-2.8) 2.1,-2.8 2.1,2.8 ccw(c1.8,2.8) 1.8,3.1 -1.8,3.1 ccw(c-1.8,2.8) -2.1,2.8 -2.1,-2.8
Mechanical 15:
  lines w0.05: -3.325,-3.75 3.325,-3.75 3.325,3.75 -3.325,3.75 -3.325,-3.75
3D body "OSC_SILICON-LAB_SI510-6N.stp": height 1.8, standoff 0, extent -2.5,-3.5 2.5,3.5

## OSC_SILICON-LAB_SI570 [mm] "Oscillator Si570 Series, 8 pins, 5x7mm"
height 1.85
pads (8):
  rect 2.15x1.7 smd: 1(-2.1,2.54) 2(-2.1,0) 3(-2.1,-2.54) 4(2.1,-2.54) 5(2.1,0) 6(2.1,2.54)
  rect 1.3x1.545 smd: 7(0,2.853) 8(0,-2.853)
Top Overlay:
  circle w0.25: c-3.875,2.625 r0.125
  lines w0.2: -0.65,-1.75 -0.65,1.75 0.65,1.75 0.65,-1.75 -0.65,-1.75
Mechanical 8:
  lines w0.1: -2.6,-2.54 -2.1,-2.54 ; -2.6,0 -2.1,0 ; -2.6,2.54 -2.1,2.54 ; -2.1,-3.04 -2.1,-2.54 ; -2.1,-2.04 -2.1,-2.54 ; -2.1,-0.5 -2.1,0 ; -2.1,0.5 -2.1,0 ; -2.1,2.04 -2.1,2.54 ; -2.1,3.04 -2.1,2.54 ; -1.6,-2.54 -2.1,-2.54 ; -1.6,0 -2.1,0 ; -1.6,2.54 -2.1,2.54 ; -0.5,-2.853 0,-2.853 ; -0.5,0 0,0 ; -0.5,2.853 0,2.853 ; 0,-3.353 0,-2.853 ; 0,-2.353 0,-2.853 ; 0,-0.5 0,0 ; 0,0.5 0,0 ; 0,2.353 0,2.853 ; 0,3.353 0,2.853 ; 0.5,-2.853 0,-2.853 ; 0.5,0 0,0 ; 0.5,2.853 0,2.853 ; 1.6,-2.54 2.1,-2.54 ; 1.6,0 2.1,0 ; 1.6,2.54 2.1,2.54 ; 2.1,-3.04 2.1,-2.54 ; 2.1,-2.04 2.1,-2.54 ; 2.1,-0.5 2.1,0 ; 2.1,0.5 2.1,0 ; 2.1,2.04 2.1,2.54 ; 2.1,3.04 2.1,2.54 ; 2.6,-2.54 2.1,-2.54 ; 2.6,0 2.1,0 ; 2.6,2.54 2.1,2.54
Mechanical 14:
  circle w0.1: c-1.7,2.55 r0.4
  lines w0.1: -2.5,-3.2 ccw(c-2.2,-3.2) -2.2,-3.5 2.2,-3.5 ccw(c2.2,-3.2) 2.5,-3.2 2.5,3.2 ccw(c2.2,3.2) 2.2,3.5 -2.2,3.5 ccw(c-2.2,3.2) -2.5,3.2 -2.5,-3.2
Mechanical 15:
  lines w0.05: -3.425,-3.875 -3.425,3.875 3.425,3.875 3.425,-3.875 -3.425,-3.875
3D body "OSC_SILICON-LAB_SI570.stp": height 1.85, standoff 0, extent -2.5,-3.5 2.5,3.5

## OSC_SILICON-LAB_SI571 [mm] "Oscillator Si571 Series, 8 pins, 5x7mm"
height 1.85
pads (8):
  rect 2.15x1.7 smd: 1(-2.1,2.54) 2(-2.1,0) 3(-2.1,-2.54) 4(2.1,-2.54) 5(2.1,0) 6(2.1,2.54)
  rect 1.3x1.545 smd: 7(0,2.853) 8(0,-2.853)
Top Overlay:
  circle w0.25: c-3.875,2.625 r0.125
  lines w0.2: -0.65,-1.75 0.65,-1.75 0.65,1.75 -0.65,1.75 -0.65,-1.75
Mechanical 8:
  lines w0.1: -2.6,-2.54 -2.1,-2.54 ; -2.6,0 -2.1,0 ; -2.6,2.54 -2.1,2.54 ; -2.1,-3.04 -2.1,-2.54 ; -2.1,-2.04 -2.1,-2.54 ; -2.1,-0.5 -2.1,0 ; -2.1,0.5 -2.1,0 ; -2.1,2.04 -2.1,2.54 ; -2.1,3.04 -2.1,2.54 ; -1.6,-2.54 -2.1,-2.54 ; -1.6,0 -2.1,0 ; -1.6,2.54 -2.1,2.54 ; -0.5,-2.853 0,-2.853 ; -0.5,0 0,0 ; -0.5,2.853 0,2.853 ; 0,-3.353 0,-2.853 ; 0,-2.353 0,-2.853 ; 0,-0.5 0,0 ; 0,0.5 0,0 ; 0,2.353 0,2.853 ; 0,3.353 0,2.853 ; 0.5,-2.853 0,-2.853 ; 0.5,0 0,0 ; 0.5,2.853 0,2.853 ; 1.6,-2.54 2.1,-2.54 ; 1.6,0 2.1,0 ; 1.6,2.54 2.1,2.54 ; 2.1,-3.04 2.1,-2.54 ; 2.1,-2.04 2.1,-2.54 ; 2.1,-0.5 2.1,0 ; 2.1,0.5 2.1,0 ; 2.1,2.04 2.1,2.54 ; 2.1,3.04 2.1,2.54 ; 2.6,-2.54 2.1,-2.54 ; 2.6,0 2.1,0 ; 2.6,2.54 2.1,2.54
Mechanical 14:
  circle w0.1: c-1.7,2.55 r0.4
  lines w0.1: -2.5,-3.2 ccw(c-2.2,-3.2) -2.2,-3.5 2.2,-3.5 ccw(c2.2,-3.2) 2.5,-3.2 2.5,3.2 ccw(c2.2,3.2) 2.2,3.5 -2.2,3.5 ccw(c-2.2,3.2) -2.5,3.2 -2.5,-3.2
Mechanical 15:
  lines w0.05: -3.425,-3.875 3.425,-3.875 3.425,3.875 -3.425,3.875 -3.425,-3.875
3D body "OSC_SILICON-LAB_SI571.stp": height 1.85, standoff 0, extent -2.5,-3.5 2.5,3.5

## OSC_TEXAS_SIA0008B [mm] "Oscillator Package SIA, 8 pins, 5x7mm"
height 1.15
pads (8):
  rect 1x1.4 smd: 1(-1.85,2.54) 2(-1.85,0) 3(-1.85,-2.54) 4(1.85,-2.54) 5(1.85,0) 6(1.85,2.54)
  rect 0.8x0.8 smd: 7(0,2.865) 8(0,-2.865)
Top Overlay:
  circle w0.25: c-3.2,2.625 r0.125
Mechanical 8:
  lines w0.05: -2.35,-2.54 -1.85,-2.54 ; -2.35,0 -1.85,0 ; -2.35,2.54 -1.85,2.54 ; -1.85,-3.04 -1.85,-2.54 ; -1.85,-2.04 -1.85,-2.54 ; -1.85,-0.5 -1.85,0 ; -1.85,0.5 -1.85,0 ; -1.85,2.04 -1.85,2.54 ; -1.85,3.04 -1.85,2.54 ; -1.35,-2.54 -1.85,-2.54 ; -1.35,0 -1.85,0 ; -1.35,2.54 -1.85,2.54 ; -0.5,-2.865 0,-2.865 ; -0.5,0 0,0 ; -0.5,2.865 0,2.865 ; 0,-3.365 0,-2.865 ; 0,-2.365 0,-2.865 ; 0,-0.5 0,0 ; 0,0.5 0,0 ; 0,2.365 0,2.865 ; 0,3.365 0,2.865 ; 0.5,-2.865 0,-2.865 ; 0.5,0 0,0 ; 0.5,2.865 0,2.865 ; 1.35,-2.54 1.85,-2.54 ; 1.35,0 1.85,0 ; 1.35,2.54 1.85,2.54 ; 1.85,-3.04 1.85,-2.54 ; 1.85,-2.04 1.85,-2.54 ; 1.85,-0.5 1.85,0 ; 1.85,0.5 1.85,0 ; 1.85,2.04 1.85,2.54 ; 1.85,3.04 1.85,2.54 ; 2.35,-2.54 1.85,-2.54 ; 2.35,0 1.85,0 ; 2.35,2.54 1.85,2.54 ; -2.35,-3.24 -1.35,-3.24 -1.35,-1.84 -2.35,-1.84 -2.35,-3.24 ; -2.35,-0.7 -1.35,-0.7 -1.35,0.7 -2.35,0.7 -2.35,-0.7 ; -2.35,1.84 -1.35,1.84 -1.35,3.24 -2.35,3.24 -2.35,1.84 ; -0.4,-3.265 -0.4,-2.465 0.4,-2.465 0.4,-3.265 -0.4,-3.265 ; -0.4,2.465 0.4,2.465 0.4,3.265 -0.4,3.265 -0.4,2.465 ; 1.35,-3.24 1.35,-1.84 2.35,-1.84 2.35,-3.24 1.35,-3.24 ; 1.35,-0.7 1.35,0.7 2.35,0.7 2.35,-0.7 1.35,-0.7 ; 1.35,1.84 1.35,3.24 2.35,3.24 2.35,1.84 1.35,1.84
Mechanical 14:
  lines w0.1: -2.55,-3.55 2.55,-3.55 2.55,3.55 -2.55,3.55 -2.55,-3.55
Mechanical 15:
  lines w0.05: -2.8,-3.8 -2.8,3.8 2.8,3.8 2.8,-3.8 -2.8,-3.8
3D body "OSC_TEXAS_SIA0008B.stp": height 1.15, standoff 0, extent -2.55,-3.55 2.55,3.55